# Altium footprint library Library.PcbLib: 225 footprints (part 11 of 16)
Each footprint in its own frame and in the unit in brackets; x right, y up, seen from the top. Pads: shape width x height; smd on the part's side, far side on the other; paste and mask are expansions set on the pad; w line width, h text height; cw(c..) or ccw(c..) is an arc to the next point about the centre after c.
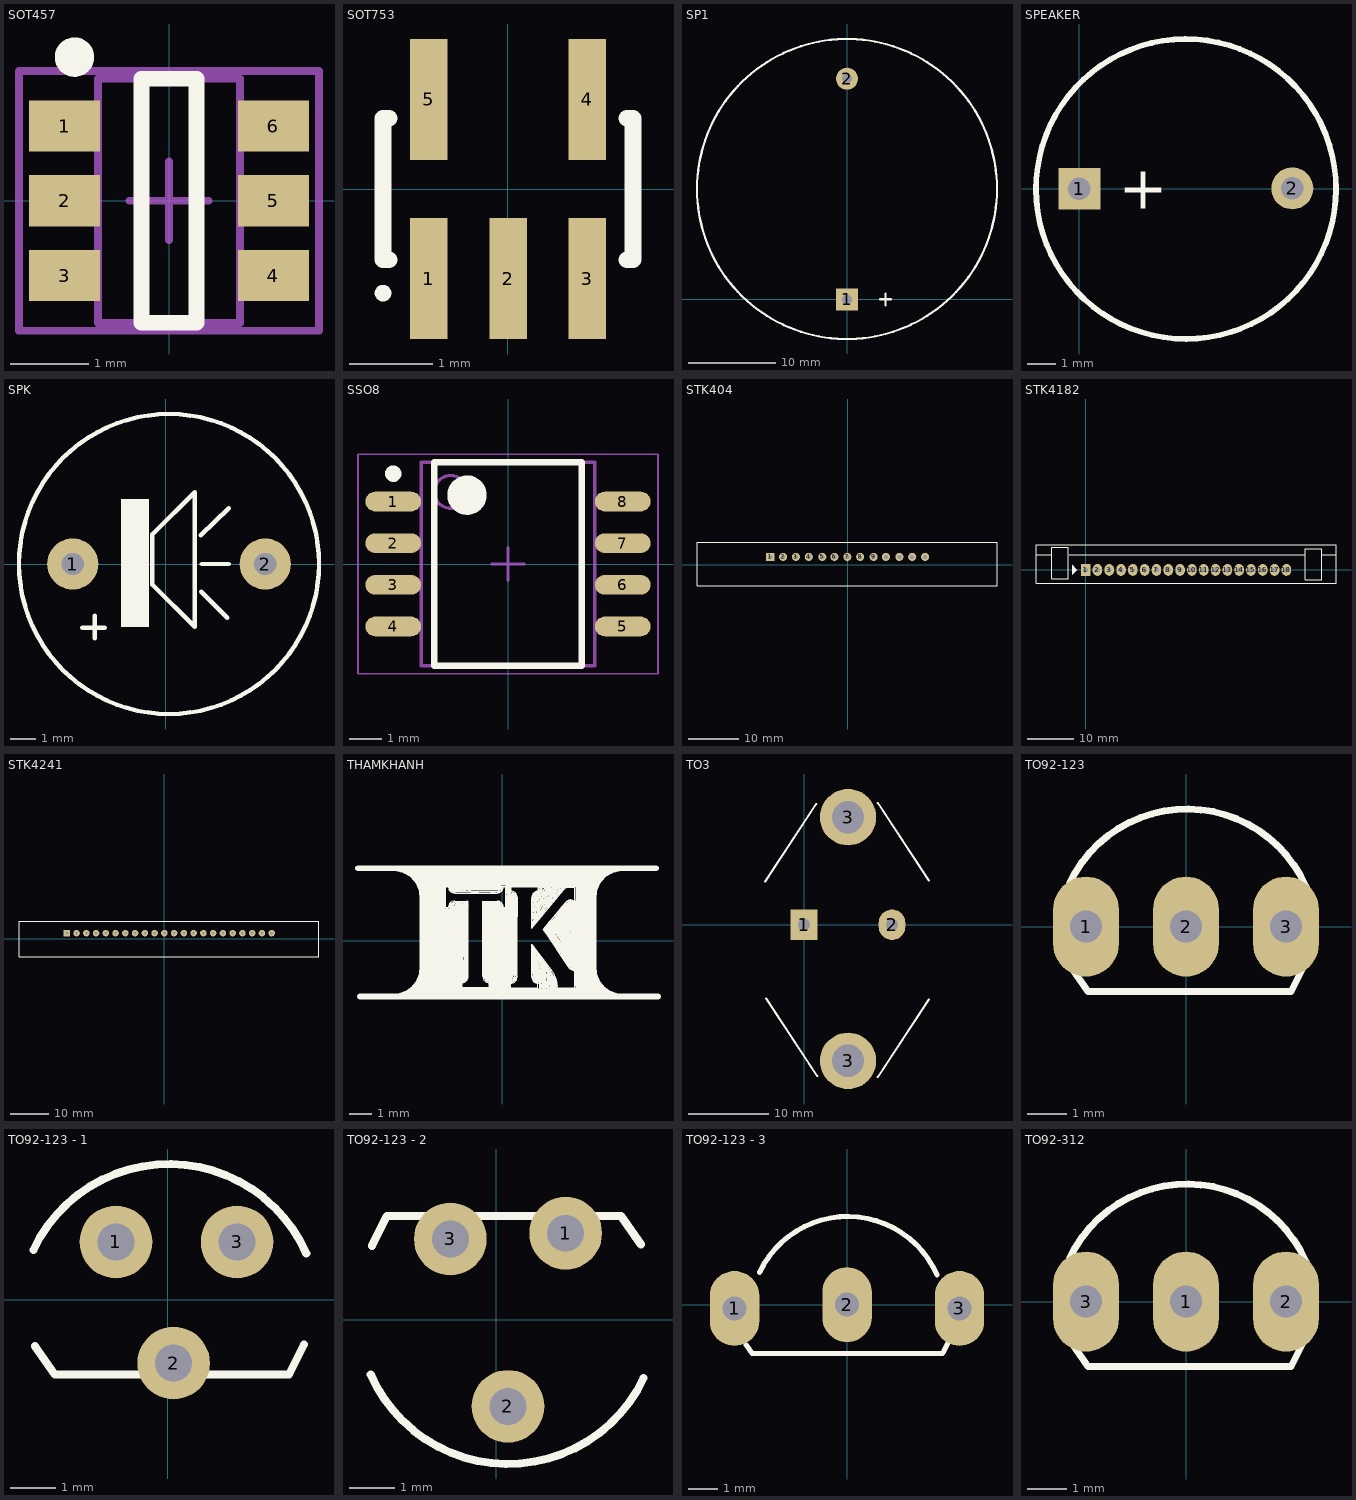
[diagram p10: the footprints below, top view; thin cyan lines are the x and y axes]

## SOT457 [mm] "SOT23, 6-Leads, Body 2.9x1.5mm, Pitch 0.95mm, Lead Span 2.8mm, IPC High Density"
height 1.1
pads (6):
  rect 0.9x0.65 smd: 1(-1.327,0.95) 2(-1.327,0) 3(-1.327,-0.95) 4(1.327,-0.95) 5(1.327,0) 6(1.327,0.95)
Top Overlay:
  circle w0.25: c-1.2,1.825 r0.125
  lines w0.2: -0.35,-1.55 -0.35,1.55 0.35,1.55 0.35,-1.55 -0.35,-1.55
Mechanical 13:
  lines w0.1: -0.9,-1.55 0.9,-1.55 0.9,1.55 -0.9,1.55 -0.9,-1.55
Mechanical 15:
  lines w0.1: -0.5,0 0.5,0 ; 0,-0.5 0,0.5 ; -1.905,-1.65 1.905,-1.65 1.905,1.65 -1.905,1.65 -1.905,-1.65
3D body "User Library-SOT23-6.step": height 1.3, standoff 0, extent -1.5,-1.5 1.5,1.5

## SOT753 [mm] "SOT-23/SC-74A; 5 Leads; Body 3.1 x 3 mm, inc. leads (LxW max)"
height 1.1
pads (5):
  rect 0.45x1.45 smd: 1(-0.95,-1.075) 2(0,-1.075) 3(0.95,-1.075) 4(0.95,1.075) 5(-0.95,1.075)
Top Overlay:
  circle w0.1: c-1.5,-1.25 r0.05
  lines w0.2: -1.425,-0.85 -1.5,-0.85 -1.5,0.85 -1.425,0.85 ; 1.425,-0.85 1.5,-0.85 1.5,0.85 1.425,0.85
3D body "User Library-SOT753.step": height 1.1, standoff 0, extent -1.55,-1.5 1.55,1.5

## SP1 [mil] "Speaker Telphone on Broad"
height 3
pads (2):
  rect 100x100 hole 45: 1(0,0)
  round 100 hole 45: 2(0,1000)
Top Overlay:
  circle w10: c0,500 r680
  lines w10: 150,0 200,0 ; 174,-28 174,26
3D body "Sonitron-SCS-32 p10-DEFAULT.STEP": height 382.53, standoff -227.75, extent -666.7,-174.54 652.2,1144.36

## SPEAKER [mm]
pads (2):
  rect 1.5x1.5 hole 0.8: 1(0,0)
  round 1.5 hole 0.8: 2(7.62,0.013)
Top Overlay:
  lines w0.203: 7.724,3.67 ccw(c3.816,-0.008) 7.76,3.632
  text "+" at 1.41,-0.711 h1.52
3D body "User Library-Buzzer WST-1203UX.step": height 4.5, standoff -9.65, extent -2.215,-6 13.239,6

## SPK [mil] "Speaker Chip"
height 500
pads (2):
  round 80 hole 35: 1(-145,0) 2(155,0)
Top Overlay:
  circle w7: c5,0 r233.73
  rectangle: -70,-98 -26,101
  lines w7: -130,-99 -95,-99 ; -111,-116 -111,-81 ; 54.52,44.52 98,87 ; 55,-43 96,-84 ; 56,0 98,0 ; -21,-32 -21,46 45,112 45,-98 -21,-32
3D body "Sonitron-SCS-17 P10-DEFAULT.STEP": height 343.51, standoff -267.12, extent -366,-354.14 366.28,378.14

## SSO8 [mm] "SSOIC, 8-Leads, Body 6.20x5.30mm, Pitch 1.27mm, IPC Medium Density"
height 1.5
pads (8):
  oval 1.7x0.6 smd: 1(-3.5,1.905) 2(-3.5,0.635) 3(-3.5,-0.635) 4(-3.5,-1.905) 5(3.5,-1.905) 6(3.5,-0.635) 7(3.5,0.635) 8(3.5,1.905)
Top Overlay:
  circle w0.25: c-3.5,2.755 r0.125
  circle w0.6: c-1.25,2.1 r0.3
  lines w0.2: -2.25,-3.1 -2.25,3.1 2.25,3.1 2.25,-3.1 -2.25,-3.1
Mechanical 13:
  circle w0.1: c-1.75,2.2 r0.5
  lines w0.1: -2.65,-3.1 -2.65,3.1 2.65,3.1 2.65,-3.1 -2.65,-3.1
Mechanical 15:
  lines w0.05: -4.575,-3.35 -4.575,3.35 4.575,3.35 4.575,-3.35 -4.575,-3.35
  lines w0.1: -0.5,0 0.5,0 ; 0,-0.5 0,0.5
3D body "SOIC127P760X150-8N.step": height 1.5, standoff 0, extent -3.81,-3.1 3.81,3.1

## STK404 [mm]
pads (13):
  rect 1.6x1.6 hole 0.8: 1(-15.367,1.524)
  round 1.6 hole 0.8: 2(-12.827,1.524) 3(-10.287,1.524) 4(-7.747,1.524) 5(-5.08,1.524) 6(-2.667,1.524) 7(-0.127,1.524) 8(2.413,1.524) 9(5.08,1.524) 10(7.493,1.524) 11(10.16,1.524) 12(12.7,1.524) 13(15.24,1.524)
Top Overlay:
  lines w0.2: -29.845,-4.191 29.464,-4.191 29.464,4.445 -26.543,4.445 -29.845,4.445 -29.845,-4.191
3D body "User Library-STK404-130S.step": height 1.9, standoff -34.01, extent -29.727,-4.115 29.473,4.445
3D body: height 81, standoff 0, extent -44.45,4.572 48.26,10.058
3D body: height 3, standoff 0, extent -44.45,10.058 48.26,44.45
3D body: height 17, standoff 15, extent -44.45,10.058 48.26,44.45
3D body: height 10, standoff 8, extent -44.45,10.058 48.26,44.45
3D body: height 52, standoff 50, extent -44.45,10.058 48.26,44.45
3D body: height 24, standoff 22, extent -44.45,10.058 48.26,44.45
3D body: height 81, standoff 78, extent -44.45,10.058 48.26,44.45
3D body: height 59, standoff 57, extent -44.45,10.058 48.26,44.45
3D body: height 73, standoff 71, extent -44.45,10.058 48.26,44.45
3D body: height 66, standoff 64, extent -44.45,10.058 48.26,44.45
3D body: height 31, standoff 29, extent -44.45,10.058 48.26,44.45
3D body: height 38, standoff 36, extent -44.45,10.058 48.26,44.45
3D body: height 45, standoff 43, extent -44.45,10.058 48.26,44.45

## STK4182 [mil] "Pin to pin 100mil, 18 pin"
pads (18):
  rect 80x100 hole 40: 1(0,0)
  oval 80x100 hole 40: 2(100,0) 3(200,0) 4(300,0) 5(400,0) 6(500,0) 7(600,0) 8(700,0) 9(800,0) 10(900,0) 11(1000,0) 12(1100,0) 13(1200,0) 14(1300,0) 15(1400,0) 16(1500,0) 17(1600,0) 18(1700,0)
Top Overlay:
  region: -115,42.5 -115,-42.5 -75,-2.5 -75,2.5
  lines w10: -420,130 -285,130 ; -140,130 1860,130 ; 2000,130 2120,130 ; -420,-115 -420,215 2120,215 2120,-115 -420,-115 ; -285,-75 -145,-75 -145,190 -285,190 -285,-75 ; 1860,-85 1860,180 2000,180 2000,-85 1860,-85

## STK4241 [mm]
pads (22):
  rect 1.7x1.7 hole 0.8: 1(-25.4,1.397)
  round 1.7 hole 0.8: 2(-22.86,1.397) 3(-20.32,1.397) 4(-17.78,1.397) 5(-15.24,1.397) 6(-12.7,1.397) 7(-10.16,1.397) 8(-7.62,1.397) 9(-5.08,1.397) 10(-2.54,1.397) 11(0,1.397) 12(2.54,1.397) 13(5.08,1.397) 14(7.62,1.397) 15(10.16,1.397) 16(12.7,1.397) 17(15.24,1.397) 18(17.78,1.397) 19(20.32,1.397) 20(22.86,1.397) 21(25.4,1.397) 22(27.94,1.397)
Top Overlay:
  lines w0.2: -37.846,-4.699 40.259,-4.699 40.259,4.445 -26.543,4.445 -37.846,4.445 -37.846,-4.699
3D body "User Library-STK 4241V.step": height 3.5, standoff -56, extent -37.73,-4.677 40.27,4.373
3D body: height 81, standoff 0, extent -44.45,4.572 48.26,10.058
3D body: height 3, standoff 0, extent -44.45,10.058 48.26,44.45
3D body: height 17, standoff 15, extent -44.45,10.058 48.26,44.45
3D body: height 10, standoff 8, extent -44.45,10.058 48.26,44.45
3D body: height 52, standoff 50, extent -44.45,10.058 48.26,44.45
3D body: height 24, standoff 22, extent -44.45,10.058 48.26,44.45
3D body: height 81, standoff 78, extent -44.45,10.058 48.26,44.45
3D body: height 59, standoff 57, extent -44.45,10.058 48.26,44.45
3D body: height 73, standoff 71, extent -44.45,10.058 48.26,44.45
3D body: height 66, standoff 64, extent -44.45,10.058 48.26,44.45
3D body: height 31, standoff 29, extent -44.45,10.058 48.26,44.45
3D body: height 38, standoff 36, extent -44.45,10.058 48.26,44.45
3D body: height 45, standoff 43, extent -44.45,10.058 48.26,44.45

## THAMKHANH [mm]
Top Overlay:
  drawing of 1111 lines, arcs and shapes, not listed

## TO3 [mil]
pads (4):
  rect 130x150 hole 60: 1(0,0)
  oval 130x150 hole 60: 2(430,0)
  round 275.59 hole 157.48: 3(215,-665) 3(215,525)
Top Overlay:
  lines w10: -190,210 60,590 ; -185,-360 65,-740 ; 360,-745 610,-365 ; 360,595 610,215
3D body "User Library-2N3055-TO-3.step": height 322.83, standoff -468.5, extent -277.13,-837.71 707.12,697.62

## TO92-123 [mil] "TO-92"
height 200
pads (3):
  oval 66x100 hole 32: 1(-100,0) 2(0,0) 3(100,0)
Top Overlay:
  lines w7: -116.52,43.21 cw(c0.97,-12.43) 119.94,39.97 ; -115.34,-40.24 -98,-65 105,-65 118,-39
3D body "SW3dPS-TO92.STEP": height 245.04, standoff -199.79, extent -108.87,-65.56 108.86,95

## TO92-123 - 1 [mil] "TO-92"
height 200
pads (3):
  round 62.99 hole 32: 1(-45,50) 2(5,-55) 3(60,50)
Top Overlay:
  lines w7: -116.52,43.21 cw(c0.97,-12.43) 119.94,39.97 ; -115.34,-40.24 -98,-65 105,-65 118,-39
3D body "User Library-TO-92_CF127SB127.step": height 334.65, standoff -157.48, extent -93.39,-57.87 103.4,98.43

## TO92-123 - 2 [mil] "TO-92"
height 200
pads (3):
  round 62.99 hole 32: 1(60,75) 2(10,-75) 3(-40,70)
Top Overlay:
  lines w7: -108.97,-47.4 ccw(c10,5) 127.49,-50.64 ; -108,64 -95,90 108,90 125.34,65.24
3D body "User Library-TO-92_CB127SF254.step": height 334.65, standoff -157.48, extent -88.4,-123.43 108.4,82.88

## TO92-123 - 3 [mil] "TO-92"
height 200
pads (3):
  oval 66x100 hole 32: 1(-150,-5) 2(0,0) 3(150,-5)
Top Overlay:
  lines w7: -134.46,-53.63 -126.5,-65 127.5,-65 136,-48 ; -116.52,43.21 cw(c0.97,-12.43) 119.94,39.97
3D body "User Library-TO-92_SS254.step": height 394.65, standoff -97.48, extent -159.06,-58.47 159.05,93.89

## TO92-312 [mil] "TO-92"
height 200
pads (3):
  oval 66x100 hole 32: 1(0,0) 2(100,0) 3(-100,0)
Top Overlay:
  lines w7: -116.52,43.21 cw(c0.97,-12.43) 119.94,39.97 ; -115.34,-40.24 -98,-65 105,-65 118,-39
3D body "SW3dPS-TO92.STEP": height 245.04, standoff -199.79, extent -108.87,-65.56 108.86,95